# Altium integrated library 兰格封装.IntLib: 1176 symbols (part 2 of 6)
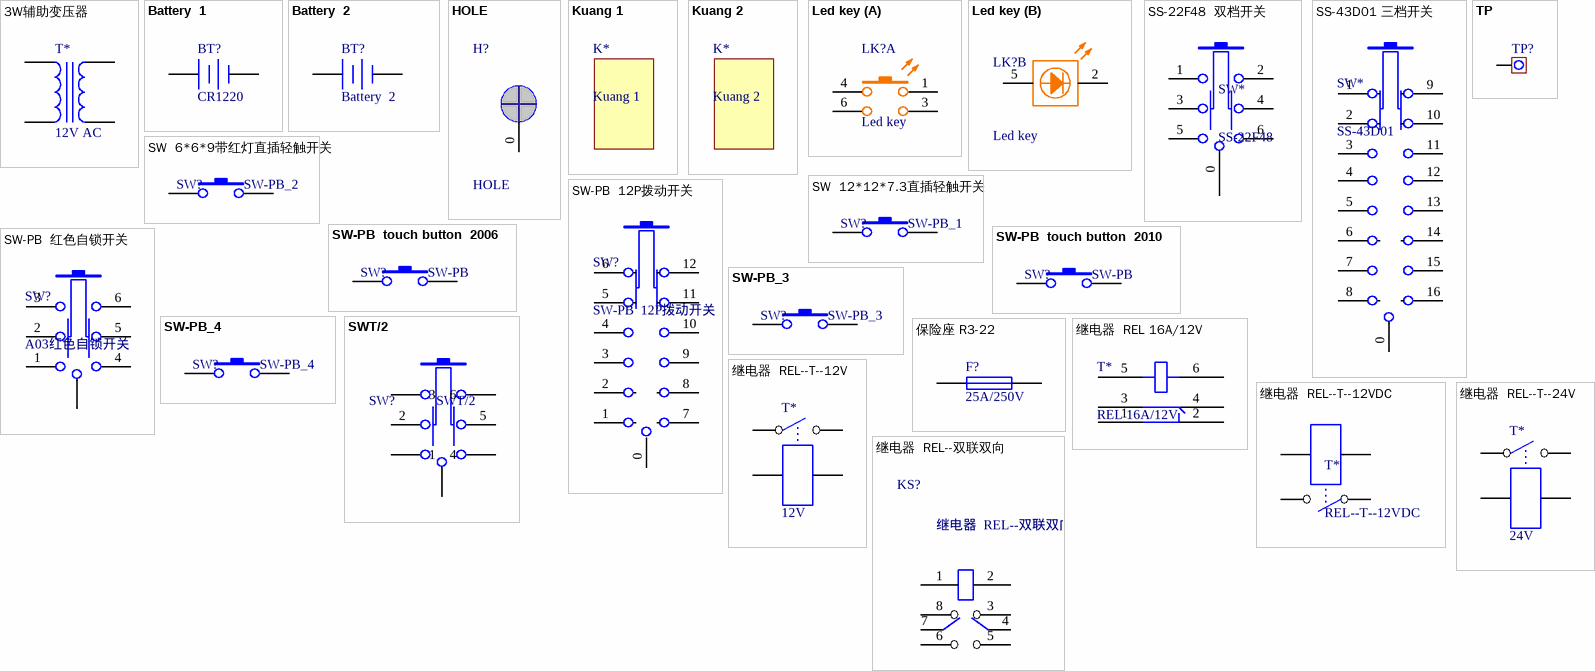
[diagram p49: symbols 3W辅助变压器 to 继电器  REL--双联双向]

## 保险座 R3-22
designator F?, comment 25A/250V
R3-22保险座; 物料代码: 3.02.08.01.0027; 助记码: R3-22BXZ; 单位: ֻ; 仓库名称: 五金仓; 加工方式: 插件; 物料名称: R3-22保险座; 规格型号: *; 备注: *
footprint 保险丝1
footprint 5X20保险座
pins: 1, 2

## 继电器  REL 16A/12V
designator T*, comment REL 16A/12V
HF115F-I/012-1HS3A继电器; 单位: ֻ; 备注: K-2000用; 物料代码: 3.01.11.0008; 助记码: HF115F-I/012-1HS3JDQ; 仓库名称: 元件仓; 加工方式: 插件; 规格型号: 16A/12V; 物料名称: HF115F-I/012-1HS3A继电器
footprint REL 16A/12V (继电器 16A/12V)
pins: 1, 2, 3, 4, 5, 6

## 继电器  REL--T--12V
designator T*, comment 12V
HF115F-I/012-1HS3A继电器; 物料代码: 3.01.11.0008; 助记码: HF115F-I/012-1HS3JDQ; 规格型号: 16A/12V; 单位: 个; 仓库名称: 元件仓; 加工方式: 插件; 物料名称: HF115F-I/012-1HS3A继电器
footprint REL T (T型继电器)
pins: 1, 2, 3, 4

## 继电器  REL--T--12VDC
designator T*, comment REL--T--12VDC
YX209E-S-112DM继电器; 单位: ֻ; 规格型号: 12VDC; 物料代码: 3.01.11.0011; 助记码: YX209E-S-112DMJDQ; 仓库名称: 元件仓; 加工方式: 插件; 物料名称: YX209E-S-112DM继电器
footprint REL T (T型继电器)
pins: 1, 2, 3, 4

## 继电器  REL--T--24V
designator T*, comment 24V
HF2150-1A-24DE继电器; 物料代码: 3.01.11.0006; 助记码: HF2150-1A-24DEJDQ; 单位: 个; 仓库名称: 元件仓; 加工方式: 插件; 物料名称: HF2150-1A-24DE继电器; 规格型号: *
footprint REL T (T型继电器)
pins: 1, 2, 3, 4

## 继电器  REL--双联双向
designator KS?
HK19F-12V-SHG继电器; 物料代码: 3.01.11.0010; 规格型号: 8脚12V 长20*宽10MM; 助记码: HK19F-12V-SHGJDQ; 仓库名称: 五金仓; 单位: 个; 加工方式: 插件; 物料名称: HK19F-12V-SHG继电器; 备注: *
footprint REL双联双向 (双联双向继电器)
pins: 1, 2, 3, 4, 5, 6, 7, 8


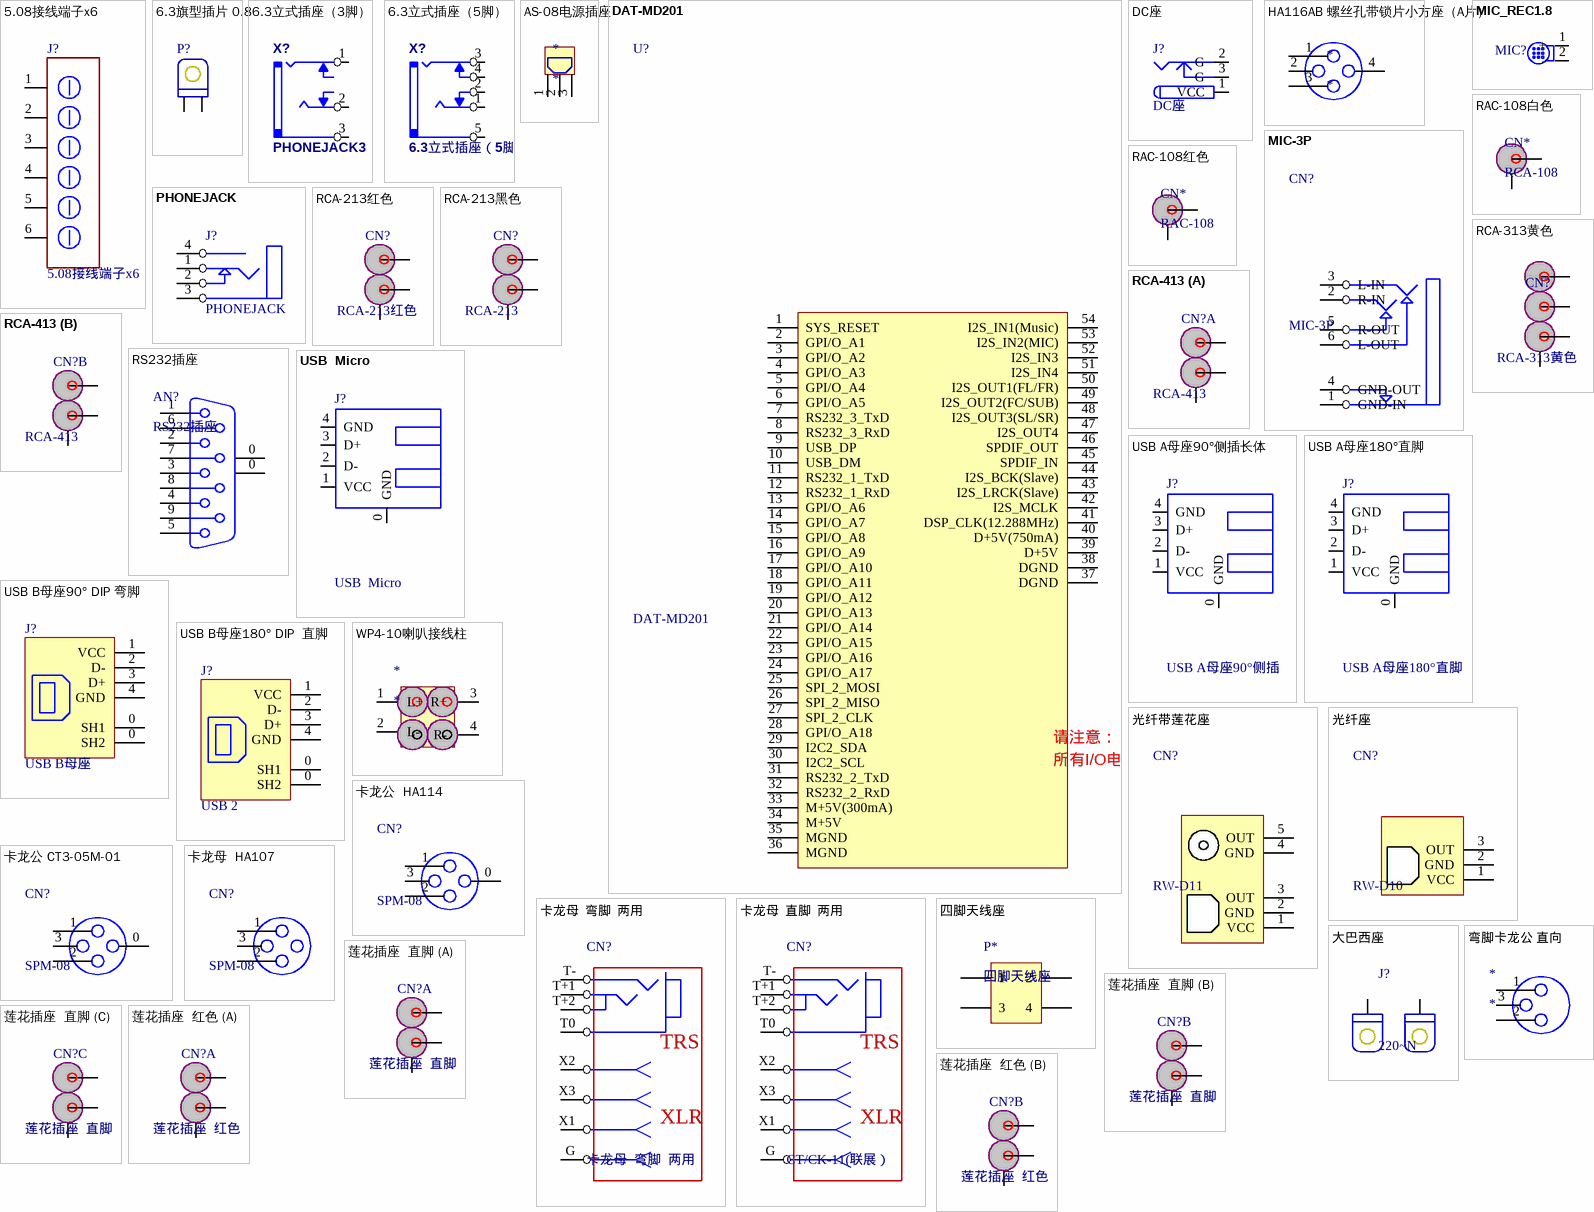
[diagram p11: symbols 5.08接线端子x6 to 莲花插座  红色]

## 5.08接线端子x6
designator J?
EX-2EDGK-5.08-6P插拔式接线端子; 物料代码: 3.02.08.05.0006; 仓库名称: 五金仓; 助记码: EX-2EDGK-5.08-6PCBSJ; 规格型号: 环铜/绿色/公母座; 单位: 套; 加工方式: 插件; 备注: T-1500用; 物料名称: EX-2EDGK-5.08-6P插拔式接线端子
footprint 5.08接线端子x6 (5.08接线端子6P   绿色)
pins: 1, 2, 3, 4, 5, 6

## 6.3旗型插片 0.8
designator P?
6.3旗型插片 0.8; 物料代码: 3.04.12.0003; 助记码: 6.3QXCP 0.8; 单位: PCS; 仓库名称: 五金仓; 物料名称: 6.3旗型插片 0.8
footprint 6.3旗型插片 0.8
pins: 1, 2

## 6.3立式插座（3脚）
designator X?, comment PHONEJACK3
6.3立式插座（3脚）单声道; 物料代码: 3.02.08.01.0011; 单位: 个; 仓库名称: 五金仓; 加工方式: 插件; 物料名称: 6.3立式插座（3脚）单声道
footprint 6.3立式座 (6.35 立式插座（3脚）  单声道)
pins: 1, 2, 3 G

## 6.3立式插座（5脚）
designator X?
6.3立式插座（5脚）立体声; 物料代码: 3.02.08.01.0012; 仓库名称: 五金仓; 单位: 个; 加工方式: 插件; 物料名称: 6.3立式插座（5脚）立体声; 助记码: *; 规格型号: *; 备注: *
footprint 6.3立式插座5脚 (6.3立式插座（5脚）立体声)
pins: 1 1a, 2 2b, 3 3c, 4 4d, 5 5e

## AS-08电源插座
designator *
单位: 个; 物料名称: AS-08电源插座; 仓库名称: 五金仓; 物料代码: 3.02.08.01.0060; 助记码: AS-08DYCZ; 规格型号: *; 备注: *; 加工方式: *
footprint AS-08电源插座
pins: 1, 2, 3

## DAT-MD201
designator U?
DAT-MD201模板; 单位: ֻ; 物料代码: *; 物料名称: *; 助记码: *; 规格型号: *; 仓库名称: *; 备注: *; 加工方式: *
pins: 1 SYS_RESET, 2 GPI/O_A1, 3 GPI/O_A2, 4 GPI/O_A3, 5 GPI/O_A4, 6 GPI/O_A5, 7 RS232_3_TxD, 8 RS232_3_RxD, 9 USB_DP, 10 USB_DM, 11 RS232_1_TxD, 12 RS232_1_RxD, 13 GPI/O_A6, 14 GPI/O_A7, 15 GPI/O_A8, 16 GPI/O_A9, 17 GPI/O_A10, 18 GPI/O_A11, 19 GPI/O_A12, 20 GPI/O_A13, 21 GPI/O_A14, 22 GPI/O_A15, 23 GPI/O_A16, 24 GPI/O_A17, 25 SPI_2_MOSI, 26 SPI_2_MISO, 27 SPI_2_CLK, 28 GPI/O_A18, 29 I2C2_SDA, 30 I2C2_SCL, 31 RS232_2_TxD, 32 RS232_2_RxD, 33 M+5V(300mA), 34 M+5V, 35 MGND, 36 MGND, 37 DGND, 38 DGND, 39 D+5V, 40 D+5V(750mA), 41 DSP_CLK(12.288MHz), 42 I2S_MCLK, 43 I2S_LRCK(Slave), 44 I2S_BCK(Slave), 45 SPDIF_IN, 46 SPDIF_OUT, 47 I2S_OUT4, 48 I2S_OUT3(SL/SR), 49 I2S_OUT2(FC/SUB), 50 I2S_OUT1(FL/FR), 51 I2S_IN4, 52 I2S_IN3, 53 I2S_IN2(MIC), 54 I2S_IN1(Music)
text: 请注意：; 所有I/O电平为3.3V

## DC座
designator J?
DC005环保电源插座; 物料代码: 3.02.08.01.0047; 助记码: DC005HBDYCZ; 规格型号: 2.1MM; 仓库名称: 五金仓; 单位: 个; 加工方式: 插件; 物料名称: DC005环保电源插座
footprint DC 座 (DC005环保电源插座    2.1MM)
pins: 1 VCC (power), 2 G (power), 3 G (power)

## HA116AB 螺丝孔带锁片小方座（A片）
designator *
HA116AB  螺丝孔带锁片小方座（A片）; 仓库名称: 五金仓; 助记码: HA116AB  LSKDSPXFZ（AP）; 单位: 个; 物料代号: 3.02.08.01.0013; 规格型号: *; 物料名称: HA116AB  螺丝孔带锁片小方座（A片）; 加工方式: *; 备注: *
footprint HA116AB  螺丝孔带锁片小方座（A片）
pins: 1 1+, 2 1-, 3 2+, 4 2-

## MIC-3P
designator CN?
6.35插座 六脚; 物料代码: 3.02.08.01.0034; 单位: 个; 助记码: 6.35CZ LJ; 规格型号: CK-6.35-636; 仓库名称: 五金仓; 加工方式: 插件; 物料名称: 6.35插座 六脚
footprint SJ-6307A(正威)
pins: 1 GND-IN, 2 R-IN, 3 L-IN, 4 GND-OUT, 5 R-OUT, 6 L-OUT

## MIC_REC1.8
designator MIC?  (value not drawn)
扬声器接口; 加工方式: 插件; 物料代码: *; 物料名称: *; 助记码: *; 规格型号: *; 单位: *; 仓库名称: *
footprint XH2A(2.54mm) (MIC)
pins: 1 +, 2 -

## PHONEJACK
designator J?
加工方式: 贴片; 单位: 个; 物料名称: *; 助记码: *; 规格型号: *
footprint PHONEJACK 3.5
pins: 1 L, 2 R, 3 GND, 4 MIC

## RAC-108白色
designator CN*, comment RCA-108
RCA-108莲花插座 白色; 仓库名称: 五金仓; 加工方式: 插件; 单位: 个; 物料代码: 3.02.08.01.0007; 物料名称: RCA-108莲花插座 白色; 规格型号: *; 助记码: *
footprint RCA-108白色 (RCA-108莲花插座  白色)
pins: 1 GND, 2

## RAC-108红色
designator CN*, comment RAC-108
RCA-108莲花插座 红色; 加工方式: 插件; 物料代码: 3.02.08.01.0008; 仓库名称: 五金仓; 单位: 个; 物料名称: RCA-108莲花插座 红色; 助记码: *; 规格型号: *
footprint RCA-108红色 (RCA-108莲花插座  红色)
pins: 1 GND, 2

## RCA-213红色
designator CN?
RCA-213莲花插座 红色; 物料代码: 3.02.08.01.0037; 单位: 个; 仓库名称: 五金仓; 加工方式: 插件; 物料名称: RCA-213莲花插座 红色; 规格型号: *
footprint RCA-213 (RCA-213莲花插座  红色)
pins: 1 GND, 2 L, 3 R

## RCA-213黑色
designator CN?, comment RCA-213
RCA-213莲花插座 黑色; 物料代码: 3.02.08.01.0003; 单位: 个; 仓库名称: 五金仓; 加工方式: 插件; 物料名称: RCA-213莲花插座 黑色; 规格型号: *
footprint RAC-213黑色 (RAC-213莲花插座黑色2)
pins: 1 GND, 2 L, 3 R

## RCA-313黄色
designator CN?
RCA-313莲花插座 黄色; 物料代码: 3.02.08.01.0038; 助记码: RCA-313LHCZ HS; 单位: 个; 仓库名称: 五金仓; 加工方式: 插件; 物料名称: RCA-313莲花插座 黄色; 规格型号: *
footprint RCA-313 (RCA-313莲花插座  黄色)
pins: 1 GND, 2 L, 3 R, 4 V

## RCA-413
designator CN?
RCA-413莲花插座 红色; 物料代码: 3.02.08.01.0006; 单位: 个; 仓库名称: 五金仓; 加工方式: 插件; 物料名称: RCA-413莲花插座 红色; 规格型号: *
footprint RCA-413 (RCA-413莲花插座  红色)
part A pins: 2 L, 3 R, 4 GND
part B pins: 1 GND, 5 L, 6 R

## RS232插座
designator AN?
仓库名称: 五金仓; 规格型号: DB-09F-01母座; 单位: 个; 物料代码: 3.02.08.01.0036; 加工方式: 插件; 助记码: RS232CZ; 物料名称: RS232插座
footprint RS232插座 (RS232插座  DB-09F-01母座)
pins: 0 MH2, 0 MH1, 1, 2, 3, 4, 5, 6, 7, 8, 9

## USB  Micro
designator J?
仓库名称: 五金仓; 单位: 个; 加工方式: 插件; 物料名称: USB  Micro; 备注: *
footprint USB  Micro
pins: 0 GND, 1 VCC, 2 D-, 3 D+, 4 GND

## USB A母座90°侧插长体
designator J?, comment USB A母座90°侧插
USB A母座90°侧插长体; 物料代码: 3.02.08.08.0006; 助记码: USB AMZ90°CCCT; 规格型号: LZ-UAF-24; 仓库名称: 五金仓; 单位: 个; 加工方式: 插件; 物料名称: USB A母座90°侧插长体; 备注: *
footprint USB 母座A 90°侧插长体 (USB A母座90°侧插长体      LZ-UAF-24)
pins: 0 GND, 1 VCC, 2 D-, 3 D+, 4 GND

## USB A母座180°直脚
designator J?
USB A母座180°直接15.0弯脚; 物料代码: 3.02.08.08.0003; 助记码: USB AMZ180°ZJ15.0WJ; 规格型号: LZ-UAF-21; 仓库名称: 五金仓; 单位: 个; 加工方式: 插件; 物料名称: USB A母座180°直接15.0弯脚; 备注: *
footprint USB 母座 A (USB  A母座180°C直接15.0弯脚    LZ-UAF-21)
pins: 0 GND, 1 VCC, 2 D-, 3 D+, 4 GND

## USB B母座90° DIP 弯脚
designator J?, comment USB B母座
USB B母座90° DIP 弯脚; 物料代码: 3.02.08.08.0004; 助记码: USB BMZ90° DIP WJ; 仓库名称: 五金仓; 规格型号: LZ-UBF-01; 单位: 个; 加工方式: 插件; 物料名称: USB B母座90° DIP 弯脚; 备注: *
footprint USB  B母座  弯脚 (USB B母座90° DIP 弯脚)
pins: 0 SH1, 0 SH2, 1 VCC, 2 D-, 3 D+, 4 GND

## USB B母座180° DIP  直脚
designator J?, comment USB 2
USB B母座180° DIP; 物料代码: 3.02.08.08.0001; 助记码: USB BMZ180° DIP; 仓库名称: 五金仓; 规格型号: LZ-UBF-02; 单位: 个; 加工方式: 插件; 物料名称: USB B母座180° DIP; 备注: *
footprint USB  B母座  直脚 (USB B母座180° DIP)
pins: 0 SH1, 0 SH2, 1 VCC, 2 D-, 3 D+, 4 GND

## WP4-10喇叭接线柱
designator *
WP4-10喇叭接线柱; 加工方式: 插件; 仓库名称: 五金仓; 助记码: WP4-10LBJXZ; 单位: 个; 物料代码: 3.02.08.05.0005; 物料名称: WP4-10喇叭接线柱; 规格型号: *
footprint WP4-10喇叭接线柱
pins: 1 L+, 2 L-, 3 R+, 4 R-

## 光纤带莲花座
designator CN?, comment RW-D11
光纤带莲花座 接收; 物料代码: 3.02.08.01.0035; 助记码: GXDLHZ JS; 仓库名称: 五金仓; 单位: 个; 加工方式: 插件; 物料名称: 光纤带莲花座 接收; 规格型号: *
footprint 光纤带莲花座 (光纤带莲花座  接收)
pins: 1 VCC (power), 2 GND (power), 3 OUT (power), 4 GND (power), 5 OUT (power)

## 光纤座
designator CN?, comment RW-D10
光纤座; 仓库名称: 五金仓; 单位: 个; 加工方式: 插件; 物料名称: 光纤座; 规格型号: *
footprint 光纤座 (光纤座  接收)
pins: 1 VCC (power), 2 GND (power), 3 OUT (power)

## 卡龙公  HA114
designator CN?, comment SPM-08
HA114卡龙公; 物料代码: 3.02.08.02.0001; 助记码: HA114KLG; 仓库名称: 五金仓; 单位: 个; 加工方式: 插件; 物料名称: HA114卡龙公; 规格型号: *
footprint 卡龙公   立式 (HA114卡龙公)
pins: 0 GND, 1 G, 2 +, 3 -

## 卡龙公 CT3-05M-01
designator CN?, comment SPM-08
CT3-05M-01卡龙公; 物料代码: 3.02.08.02.0004; 助记码: CT3-05M-01KLG; 仓库名称: 五金仓; 单位: 个; 加工方式: 插件; 物料名称: CT3-05M-01卡龙公; 规格型号: *
footprint 卡龙公 (CT3-05M-01卡龙公)
pins: 0 GND, 1 G, 2 +, 3 -

## 卡龙母  HA107
designator CN?, comment SPM-08
HA107卡龙母; 物料代码: 3.02.08.02.0002; 助记码: HA107KLM; 仓库名称: 五金仓; 单位: 个; 加工方式: 插件; 物料名称: HA107卡龙母; 规格型号: *
footprint 卡侬母 (HA107卡龙母)
pins: 1 G, 2 +, 3 -

## 卡龙母  弯脚  两用
designator CN?
CK/CT3-11W两用卡龙母弯脚; 单位: 个; 物料代码: 3.02.08.02.0006; 助记码: CK/CT3-11WLYKLMWJ; 仓库名称: 五金仓; 加工方式: 插件; 物料名称: CK/CT3-11W两用卡龙母弯脚; 规格型号: *
footprint 两用卡龙母  弯脚 (CK/CT3-11W两用卡龙母弯脚)
pins: G, T0, T+1, T+2, T-, X1, X2, X3
text: TRS; XLR

## 卡龙母  直脚  两用
designator CN?, comment CT/CK-11(联展）
CK/CT3-11两用卡龙母; 物料代码: 3.02.08.02.0005; 单位: 个; 助记码: CK/CT3-11LYKLM; 仓库名称: 五金仓; 加工方式: 插件; 物料名称: CK/CT3-11两用卡龙母; 规格型号: *
footprint 两用卡龙母 (CK/CT3-11两用卡龙母)
pins: G, T0, T+1, T+2, T-, X1, X2, X3
text: TRS; XLR

## 四脚天线座
designator P*
物料代码: 3.02.08.01.0049; 仓库名称: 五金仓; 助记码: SJTXZ; 单位: ֻ; 加工方式: 插件; 物料名称: 四脚天线座; 规格型号: *; 备注: *
footprint 四脚天线座
pins: 1, 2, 3, 4

## 大巴西座
designator J?, comment 220~N
大巴西座; 物料代码: 3.02.08.01.0043; 助记码: DBXZ; 仓库名称: 五金仓; 加工方式: 插件; 单位: 个; 物料名称: 大巴西座; 规格型号: *
footprint 大巴西座
pins: 1, 2

## 弯脚卡龙公 直向
designator *
弯脚卡龙公 直向; 仓库名称: 五金仓; 单位: 个; 物料代码: 3.02.08.02.0003; 规格型号: *; 物料名称: 弯脚卡龙公 直向; 加工方式: *; 助记码: *; 备注: *
footprint 弯脚卡龙公 直向
pins: 1 G, 2 +, 3 -

## 莲花插座  直脚
designator CN?
AV6-10直脚莲花插座 白色; 物料代码: 3.02.08.01.0044; 助记码: AV6-10ZJLHCZ BS; 单位: 个; 仓库名称: 五金仓; 加工方式: 插件; 物料名称: AV6-10直脚莲花插座 白色
footprint AV6-10 (AV6-10直脚莲花插座  白色)
part A pins: 1 GND, 2 L, 3 R
part B pins: 4 GND, 5 L, 6 R
part C pins: 7 GND, 8 L, 9 R

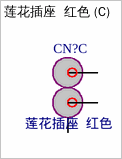
[diagram p12: symbol 莲花插座  红色]

## 莲花插座  红色
designator CN?
RCA-613莲花插座 红色; 物料代码: 3.02.08.01.0033; 助记码: RCA-613LHCZ HS; 单位: 个; 仓库名称: 五金仓; 加工方式: 插件; 物料名称: RCA-613莲花插座 红色; 规格型号: *
footprint RCA-613 (RCA-613莲花插座  红色)
part A pins: 2 L, 3 R, 4 GND
part B pins: 1 GND, 5 L, 6 R
part C pins: 7 GND, 8 L, 9 R


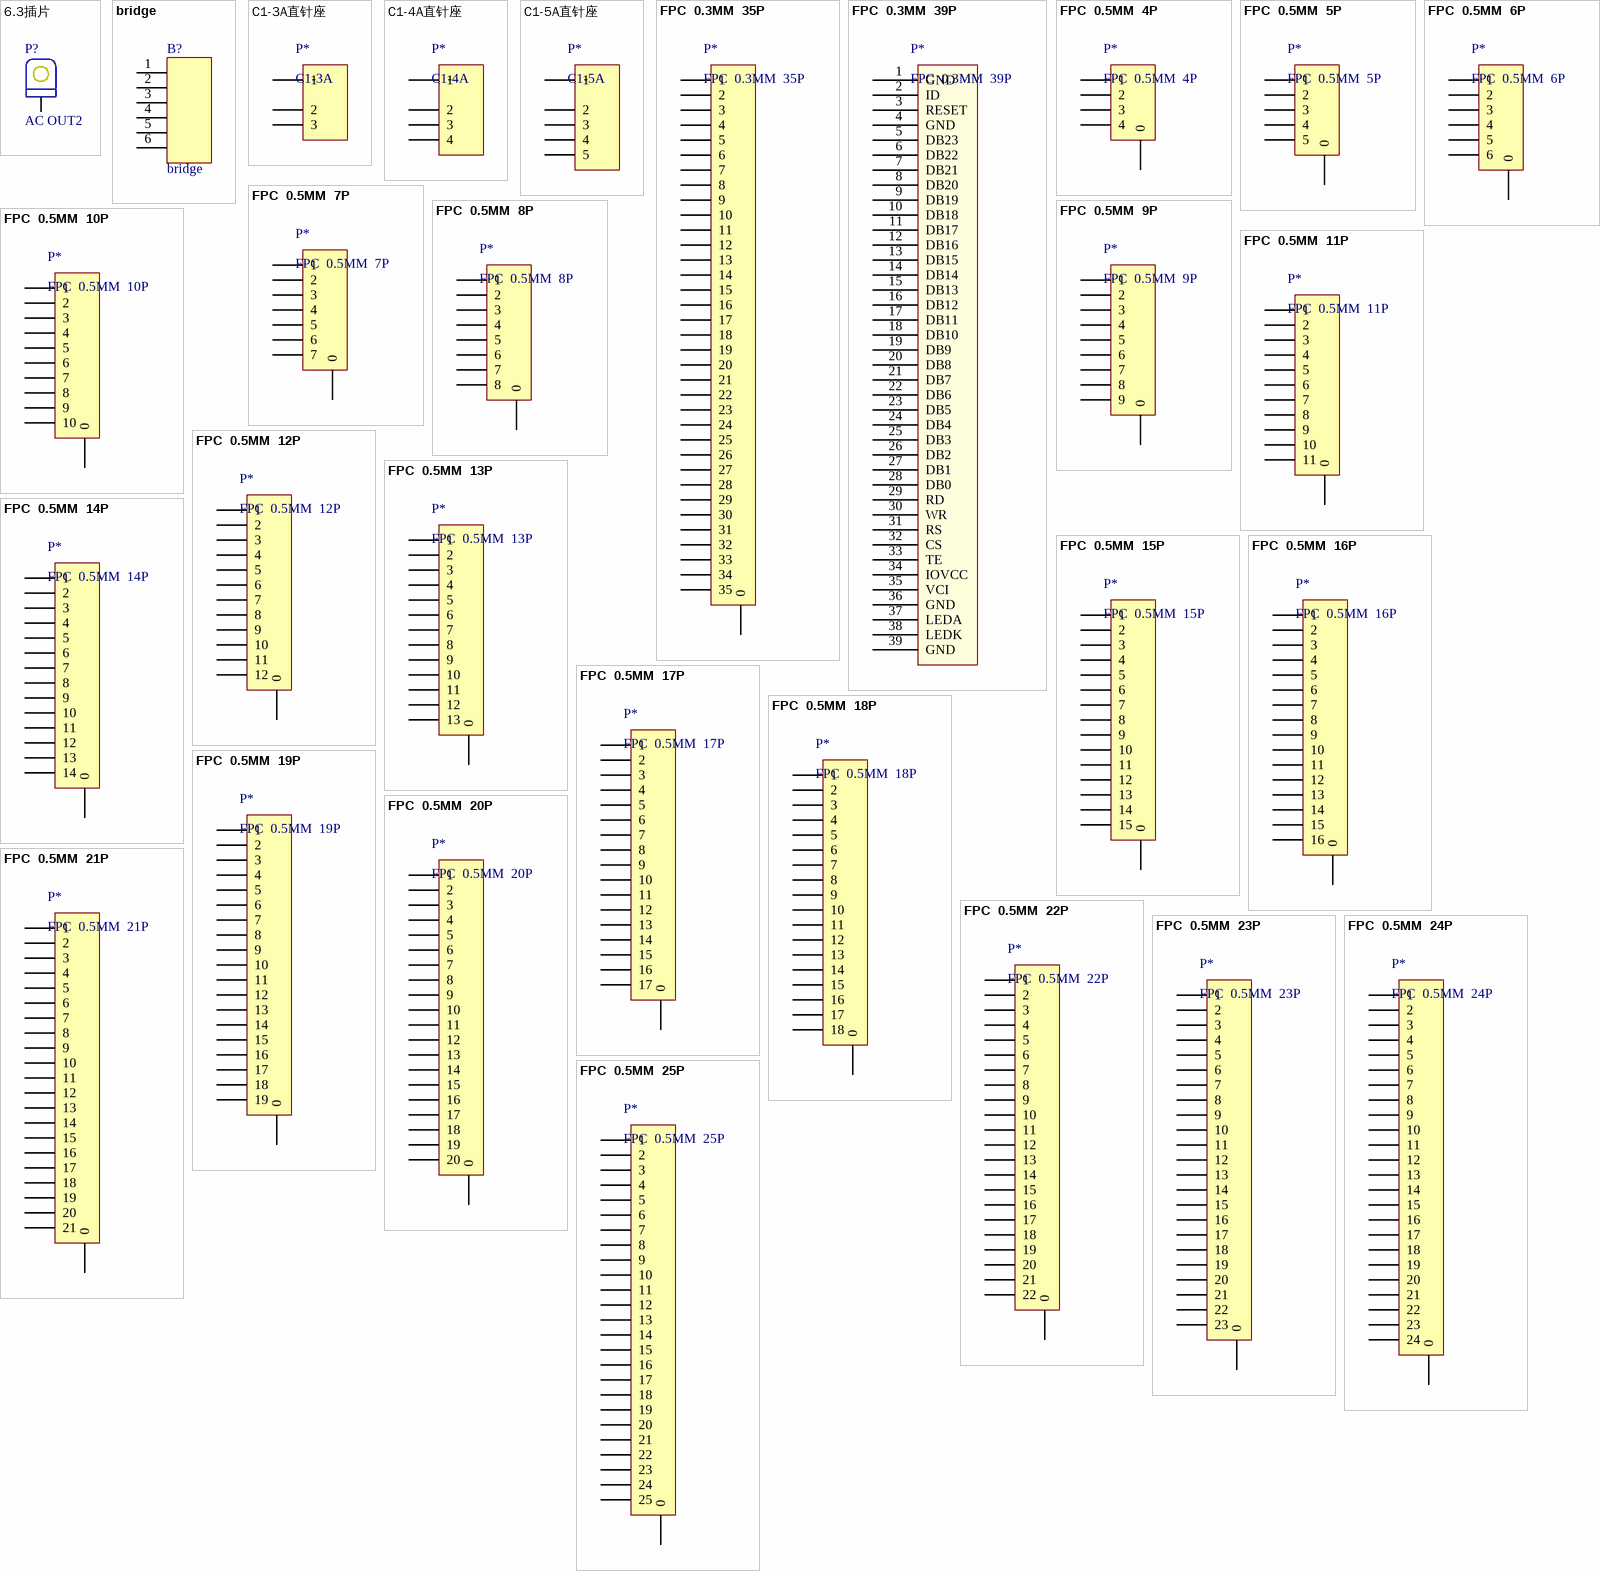
[diagram p13: symbols 6.3插片 to FPC  0.5MM  25P]

## 6.3插片
designator P?, comment AC OUT2
6.3旗型插片 0.8; 物料代码: 3.04.12.0003; 助记码: 6.3QXCP 0.8; 单位: 个; 仓库名称: 五金仓; 加工方式: 插件; 物料名称: 6.3旗型插片 0.8; 规格型号: *
footprint 6.3插片
pins: 1

## bridge
designator B?
仓库名称: 五金仓; 单位: ֻ; 加工方式: 插件; 物料名称: *; 物料代码: *; 助记码: *; 规格型号: *; 备注: *
footprint bridge (手机唛支架)
pins: 1, 2, 3, 4, 5, 6

## C1-3A直针座
designator P*, comment C1-3A
C1-3A直针座; 物料代码: 3.02.08.01.0015; 仓库名称: 五金仓; 助记码: C1-3AZZZ; 单位: 个; 加工方式: 插件; 规格型号: *; 物料名称: C1-3A直针座; 备注: *
footprint C1-3A   8MM (CA-3A直插座)
pins: 1, 2, 3

## C1-4A直针座
designator P*, comment C1-4A
C1-4A直针座; 物料代码: 3.02.08.01.0016; 仓库名称: 五金仓; 助记码: C1-4AZZZ; 单位: 个; 加工方式: 插件; 规格型号: *; 物料名称: C1-4A直针座; 备注: *
footprint C1-4A   8MM (CA-4A直插座)
pins: 1, 2, 3, 4

## C1-5A直针座
designator P*, comment C1-5A
C1-5A直针座; 物料代码: 3.02.08.01.0041; 仓库名称: 五金仓; 助记码: C1-5AZZZ; 单位: 个; 加工方式: 插件; 规格型号: *; 物料名称: C1-5A直针座; 备注: *
footprint C1-5A   8MM (CA-5A直插座)
pins: 1, 2, 3, 4, 5

## FPC  0.3MM  35P
designator P*
0.3MM间距35P翻盖式FPC连接器; 规格型号: 0.3K-DX-35PWB 1.0H 镀金/白色; 物料代码: 3.02.08.07.0013; 仓库名称: 五金仓; 助记码: 0.3MMJJ35PFGSFPCLJQ; 单位: ֻ; 加工方式: 贴片; 物料名称: 0.3MM间距35P翻盖式FPC连接器; 备注: *
footprint FPC  0.3  35P
pins: 0, 1, 2, 3, 4, 5, 6, 7, 8, 9, 10, 11, 12, 13, 14, 15, 16, 17, 18, 19, 20, 21, 22, 23, 24, 25, 26, 27, 28, 29, 30, 31, 32, 33, 34, 35

## FPC  0.3MM  39P
designator P*
0.3MM间距39P翻盖下接镀金贴片FPC连接器; 仓库名称: 五金仓; 规格型号: H1.0卷装; 单位: ֻ; 物料代码: 3.02.08.07.0016; 助记码: 0.3MMJJ39PFGXJDJTPFP; 加工方式: 贴片; 物料名称: 0.3MM间距39P翻盖下接镀金贴片FPC连接器; 备注: *
footprint FPC  0.3  39P (2006用)
pins: 1 GND, 2 ID, 3 RESET, 4 GND, 5 DB23, 6 DB22, 7 DB21, 8 DB20, 9 DB19, 10 DB18, 11 DB17, 12 DB16, 13 DB15, 14 DB14, 15 DB13, 16 DB12, 17 DB11, 18 DB10, 19 DB9, 20 DB8, 21 DB7, 22 DB6, 23 DB5, 24 DB4, 25 DB3, 26 DB2, 27 DB1, 28 DB0, 29 RD, 30 WR, 31 RS, 32 CS, 33 TE, 34 IOVCC, 35 VCI, 36 GND, 37 LEDA, 38 LEDK, 39 GND

## FPC  0.5MM  4P
designator P*
FPC0.5 2H-S-W-4P; 仓库名称: 五金仓; 加工方式: 贴片; 物料代码: *; 物料名称: *; 备注: *; 规格型号: *; 单位: *; 助记码: *
footprint FPC  0.5   04P (长：6.2mm，宽：5.2mm，高：2mm)
pins: 0, 1, 2, 3, 4

## FPC  0.5MM  5P
designator P*
FPC0.5 2H-S-W-5P; 仓库名称: 五金仓; 加工方式: 贴片; 规格型号: *; 物料名称: *; 物料代码: *; 助记码: *; 单位: *; 备注: *
footprint FPC0.5 2H-S-W-5P (长：6.7mm，宽：5.2mm，高：2mm)
pins: 0, 1, 2, 3, 4, 5

## FPC  0.5MM  6P
designator P*
FPC0.5 2H-S-W-6P; 仓库名称: 五金仓; 加工方式: 贴片; 规格型号: *; 物料名称: *; 单位: *; 物料代码: *; 助记码: *; 备注: *
footprint FPC0.5 2H-S-W-6P (长：7.2mm，宽：5.2mm，高：2mm)
pins: 0, 1, 2, 3, 4, 5, 6

## FPC  0.5MM  7P
designator P*
FPC0.5 2H-S-W-7P; 仓库名称: 五金仓; 加工方式: 贴片; 规格型号: *; 物料名称: *; 物料代码: *; 助记码: *; 单位: *; 备注: *
footprint FPC0.5 2H-S-W-7P (长：7.7mm，宽：5.2mm，高：2mm)
pins: 0, 1, 2, 3, 4, 5, 6, 7

## FPC  0.5MM  8P
designator P*
FPC0.5 2H-S-W-8P; 仓库名称: 五金仓; 加工方式: 贴片; 物料名称: *; 物料代码: *; 规格型号: *; 单位: *; 助记码: *; 备注: *
footprint FPC0.5 2H-S-W-8P (长：8.2mm，宽：5.2mm，高：2mm)
pins: 0, 1, 2, 3, 4, 5, 6, 7, 8

## FPC  0.5MM  9P
designator P*
FPC0.5 2H-S-W-9P; 仓库名称: 五金仓; 加工方式: 贴片; 规格型号: *; 助记码: *; 单位: *; 备注: *; 物料代码: *; 物料名称: *
footprint FPC0.5 2H-S-W-9P (长：8.7mm，宽：5.2mm，高：2mm)
pins: 0, 1, 2, 3, 4, 5, 6, 7, 8, 9

## FPC  0.5MM  10P
designator P*
FPC0.5 2H-S-W-10P; 仓库名称: 五金仓; 加工方式: 贴片; 助记码: *; 单位: *; 物料名称: *; 备注: *; 规格型号: *
footprint FPC  0.5  10P
pins: 0, 1, 2, 3, 4, 5, 6, 7, 8, 9, 10

## FPC  0.5MM  11P
designator P*
FPC0.5 2H-S-W-11P; 仓库名称: 五金仓; 加工方式: 贴片; 物料名称: *; 规格型号: *; 单位: *; 备注: *; 助记码: *; 物料代码: *
footprint FPC  0.5  11P
pins: 0, 1, 2, 3, 4, 5, 6, 7, 8, 9, 10, 11

## FPC  0.5MM  12P
designator P*
FPC0.5 2H-S-W-12P; 仓库名称: 五金仓; 加工方式: 贴片; 物料名称: *; 物料代码: *; 规格型号: *; 助记码: *; 单位: *; 备注: *
footprint FPC  0.5  12P
pins: 0, 1, 2, 3, 4, 5, 6, 7, 8, 9, 10, 11, 12

## FPC  0.5MM  13P
designator P*
FPC0.5 2H-S-W-13P; 仓库名称: 五金仓; 加工方式: 贴片; 规格型号: *; 助记码: *; 单位: *; 备注: *; 物料代码: *; 物料名称: *
footprint FPC  0.5  13P
pins: 0, 1, 2, 3, 4, 5, 6, 7, 8, 9, 10, 11, 12, 13

## FPC  0.5MM  14P
designator P*
FPC0.5 2H-S-W-14P; 仓库名称: 五金仓; 加工方式: 贴片; 物料名称: *; 规格型号: *; 助记码: *; 单位: *; 备注: *; 物料代码: *
footprint FPC  0.5  14P
pins: 0, 1, 2, 3, 4, 5, 6, 7, 8, 9, 10, 11, 12, 13, 14

## FPC  0.5MM  15P
designator P*
FPC0.5 2H-S-W-15P; 仓库名称: 五金仓; 加工方式: 贴片; 规格型号: *; 物料代码: *; 物料名称: *; 助记码: *; 备注: *; 单位: *
footprint FPC  0.5  15P
pins: 0, 1, 2, 3, 4, 5, 6, 7, 8, 9, 10, 11, 12, 13, 14, 15

## FPC  0.5MM  16P
designator P*
FPC0.5 2H-S-W-16P; 仓库名称: 五金仓; 加工方式: 贴片; 规格型号: *; 物料代码: *; 物料名称: *; 备注: *; 单位: *; 助记码: *
footprint FPC  0.5  16P
pins: 0, 1, 2, 3, 4, 5, 6, 7, 8, 9, 10, 11, 12, 13, 14, 15, 16

## FPC  0.5MM  17P
designator P*
FPC0.5 2H-S-W-17P; 仓库名称: 五金仓; 加工方式: 贴片; 规格型号: *; 助记码: *; 单位: *; 物料代码: *; 物料名称: *; 备注: *
footprint FPC  0.5  17P
pins: 0, 1, 2, 3, 4, 5, 6, 7, 8, 9, 10, 11, 12, 13, 14, 15, 16, 17

## FPC  0.5MM  18P
designator P*
FPC0.5 2H-S-W-18P; 仓库名称: 五金仓; 加工方式: 贴片; 备注: *; 物料代码: *; 物料名称: *; 规格型号: *; 助记码: *; 单位: *
footprint FPC  0.5  18P
pins: 0, 1, 2, 3, 4, 5, 6, 7, 8, 9, 10, 11, 12, 13, 14, 15, 16, 17, 18

## FPC  0.5MM  19P
designator P*
FPC0.5 2H-S-W-19P; 仓库名称: 五金仓; 加工方式: 贴片; 规格型号: *; 物料名称: *; 助记码: *; 单位: *; 备注: *; 物料代码: *
footprint FPC  0.5  19P
pins: 0, 1, 2, 3, 4, 5, 6, 7, 8, 9, 10, 11, 12, 13, 14, 15, 16, 17, 18, 19

## FPC  0.5MM  20P
designator P*
FPC0.5 2H-S-W-20P; 仓库名称: 五金仓; 加工方式: 贴片; 助记码: *; 单位: *; 备注: *; 物料代码: *; 物料名称: *; 规格型号: *
footprint FPC  0.5  20P
pins: 0, 1, 2, 3, 4, 5, 6, 7, 8, 9, 10, 11, 12, 13, 14, 15, 16, 17, 18, 19, 20

## FPC  0.5MM  21P
designator P*
FPC0.5 2H-S-W-21P; 仓库名称: 五金仓; 加工方式: 贴片; 物料名称: *; 规格型号: *; 助记码: *; 单位: *; 备注: *; 物料代码: *
footprint FPC  0.5  21P
pins: 0, 1, 2, 3, 4, 5, 6, 7, 8, 9, 10, 11, 12, 13, 14, 15, 16, 17, 18, 19, 20, 21

## FPC  0.5MM  22P
designator P*
FPC0.5 2H-S-W-22P; 仓库名称: 五金仓; 加工方式: 贴片; 规格型号: *; 助记码: *; 备注: *; 物料代码: *; 单位: *; 物料名称: *
footprint FPC  0.5  22P
pins: 0, 1, 2, 3, 4, 5, 6, 7, 8, 9, 10, 11, 12, 13, 14, 15, 16, 17, 18, 19, 20, 21, 22

## FPC  0.5MM  23P
designator P*
FPC0.5 2H-S-W-23P; 仓库名称: 五金仓; 加工方式: 贴片; 规格型号: *; 物料名称: *; 物料代码: *; 单位: *; 备注: *; 助记码: *
footprint FPC  0.5  23P
pins: 0, 1, 2, 3, 4, 5, 6, 7, 8, 9, 10, 11, 12, 13, 14, 15, 16, 17, 18, 19, 20, 21, 22, 23

## FPC  0.5MM  24P
designator P*
FPC0.5 2H-S-W-24P; 仓库名称: 五金仓; 加工方式: 贴片; 单位: *; 助记码: *; 备注: *; 物料代码: *; 物料名称: *; 规格型号: *
footprint FPC  0.5  24P
pins: 0, 1, 2, 3, 4, 5, 6, 7, 8, 9, 10, 11, 12, 13, 14, 15, 16, 17, 18, 19, 20, 21, 22, 23, 24

## FPC  0.5MM  25P
designator P*
FPC0.5 2H-S-W-25P; 仓库名称: 五金仓; 加工方式: 贴片; 助记码: *; 单位: *; 备注: *; 物料代码: *; 物料名称: *; 规格型号: *
footprint FPC  0.5  25P
pins: 0, 1, 2, 3, 4, 5, 6, 7, 8, 9, 10, 11, 12, 13, 14, 15, 16, 17, 18, 19, 20, 21, 22, 23, 24, 25

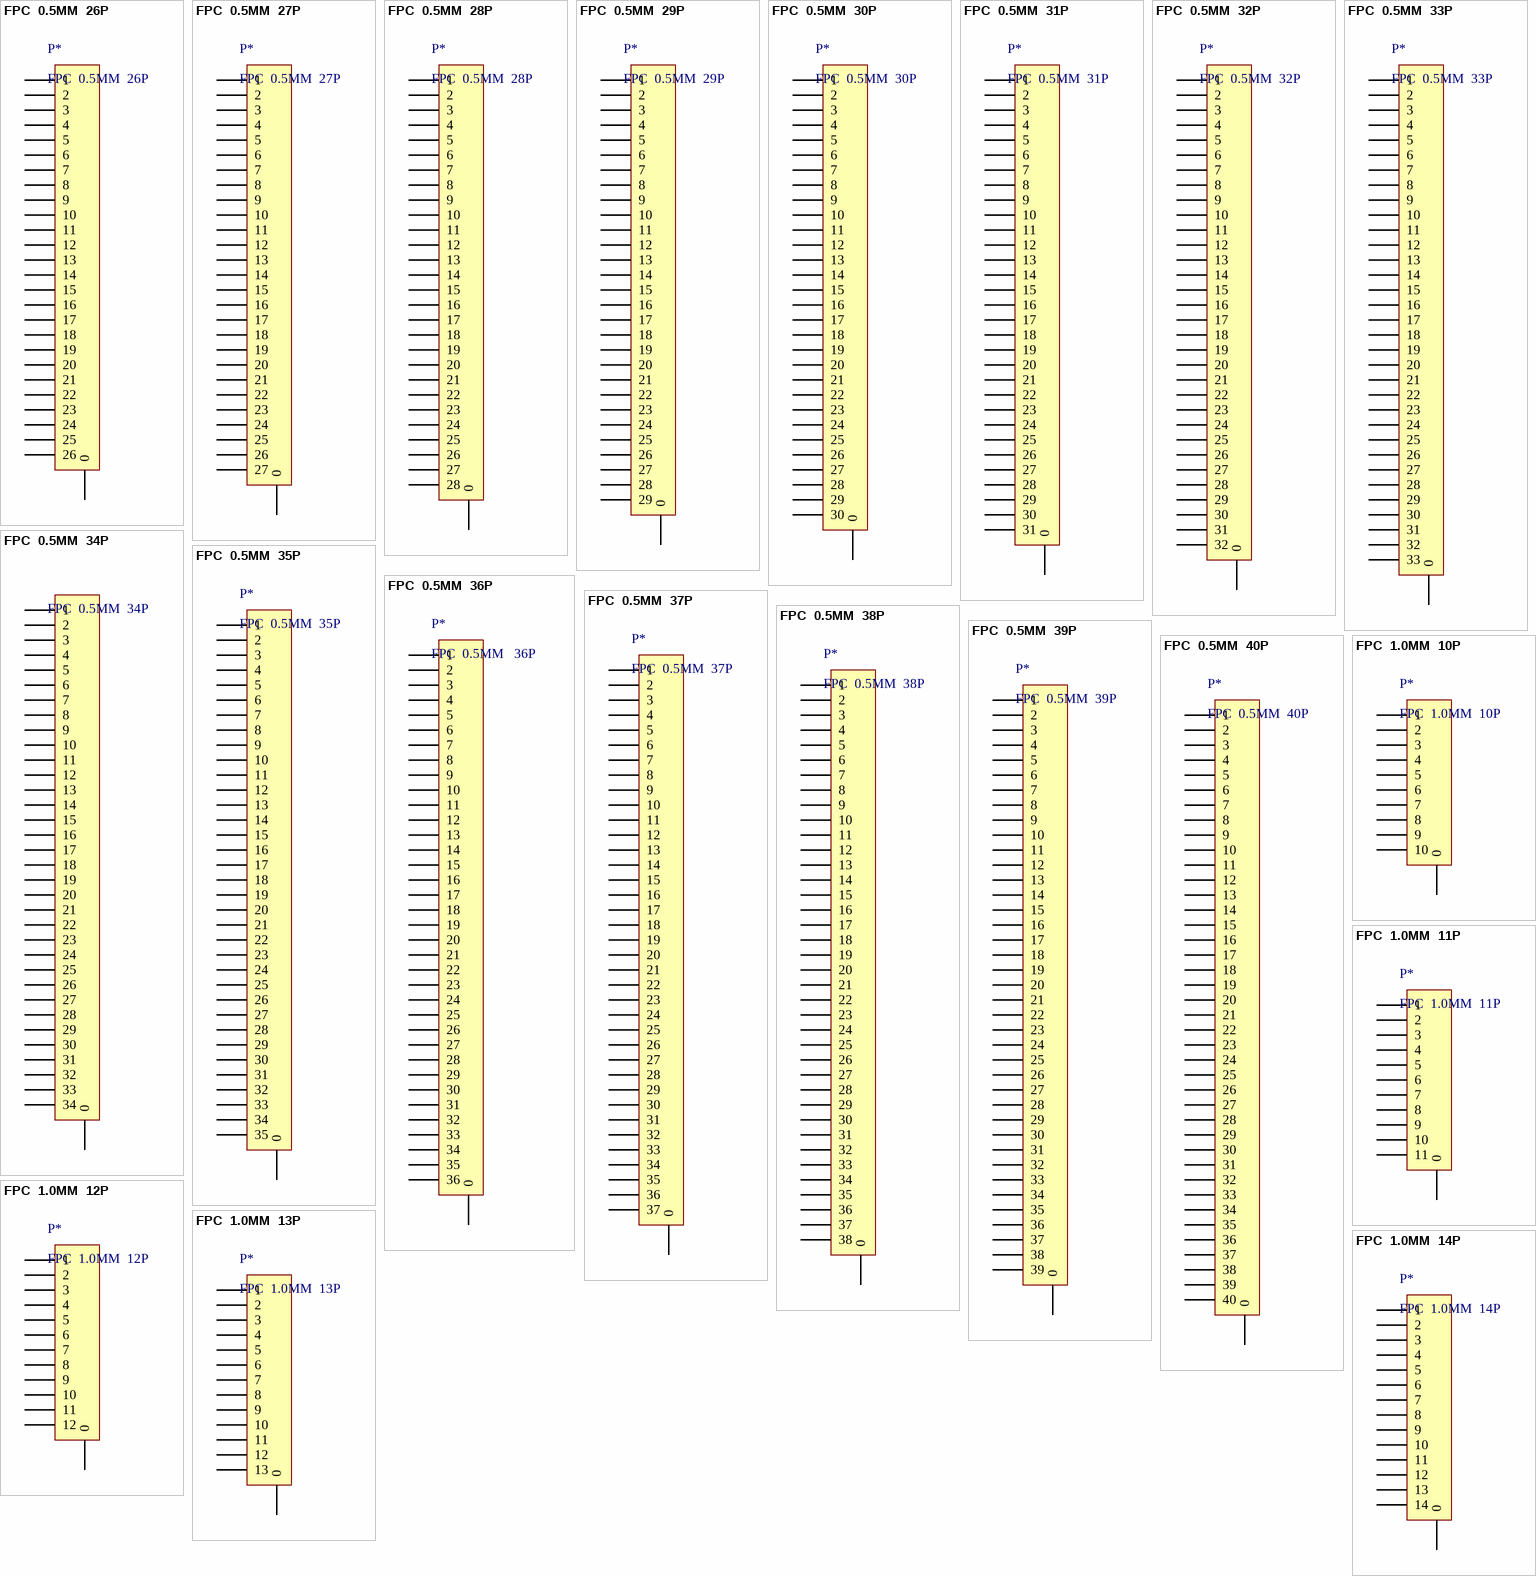
[diagram p14: symbols FPC  0.5MM  26P to FPC  1.0MM  14P]

## FPC  0.5MM  26P
designator P*
FPC0.5 2H-S-W-26P; 仓库名称: 五金仓; 加工方式: 贴片; 规格型号: *; 助记码: *; 单位: *; 备注: *; 物料代码: *; 物料名称: *
footprint FPC  0.5  26P
pins: 0, 1, 2, 3, 4, 5, 6, 7, 8, 9, 10, 11, 12, 13, 14, 15, 16, 17, 18, 19, 20, 21, 22, 23, 24, 25, 26

## FPC  0.5MM  27P
designator P*
FPC0.5 2H-S-W-27P; 仓库名称: 五金仓; 加工方式: 贴片; 单位: *; 规格型号: *; 助记码: *; 物料名称: *; 物料代码: *; 备注: *
footprint FPC  0.5  27P
pins: 0, 1, 2, 3, 4, 5, 6, 7, 8, 9, 10, 11, 12, 13, 14, 15, 16, 17, 18, 19, 20, 21, 22, 23, 24, 25, 26, 27

## FPC  0.5MM  28P
designator P*
FPC0.5 2H-S-W-28P; 仓库名称: 五金仓; 加工方式: 贴片; 物料名称: *; 规格型号: *; 物料代码: *; 助记码: *; 单位: *; 备注: *
footprint FPC  0.5  28P
pins: 0, 1, 2, 3, 4, 5, 6, 7, 8, 9, 10, 11, 12, 13, 14, 15, 16, 17, 18, 19, 20, 21, 22, 23, 24, 25, 26, 27, 28

## FPC  0.5MM  29P
designator P*
FPC0.5 2H-S-W-29P; 仓库名称: 五金仓; 加工方式: 贴片; 物料名称: *; 规格型号: *; 物料代码: *; 助记码: *; 单位: *; 备注: *
footprint FPC  0.5  29P
pins: 0, 1, 2, 3, 4, 5, 6, 7, 8, 9, 10, 11, 12, 13, 14, 15, 16, 17, 18, 19, 20, 21, 22, 23, 24, 25, 26, 27, 28, 29

## FPC  0.5MM  30P
designator P*
FPC0.5 2H-S-W-30P; 仓库名称: 五金仓; 加工方式: 贴片; 规格型号: *; 物料名称: *; 物料代码: *; 备注: *; 单位: *; 助记码: *
footprint FPC  0.5  30P
pins: 0, 1, 2, 3, 4, 5, 6, 7, 8, 9, 10, 11, 12, 13, 14, 15, 16, 17, 18, 19, 20, 21, 22, 23, 24, 25, 26, 27, 28, 29, 30

## FPC  0.5MM  31P
designator P*
FPC0.5 2H-S-W-31P; 仓库名称: 五金仓; 加工方式: 贴片; 物料名称: *; 物料代码: *; 规格型号: *; 助记码: *; 单位: *; 备注: *
footprint FPC  0.5  31P
pins: 0, 1, 2, 3, 4, 5, 6, 7, 8, 9, 10, 11, 12, 13, 14, 15, 16, 17, 18, 19, 20, 21, 22, 23, 24, 25, 26, 27, 28, 29, 30, 31

## FPC  0.5MM  32P
designator P*
FPC0.5 2H-S-W-32P; 仓库名称: 五金仓; 加工方式: 贴片; 物料名称: *; 物料代码: *; 规格型号: *; 助记码: *; 备注: *; 单位: *
footprint FPC  0.5  32P
pins: 0, 1, 2, 3, 4, 5, 6, 7, 8, 9, 10, 11, 12, 13, 14, 15, 16, 17, 18, 19, 20, 21, 22, 23, 24, 25, 26, 27, 28, 29, 30, 31, 32

## FPC  0.5MM  33P
designator P*
FPC0.5 2H-S-W-33P; 仓库名称: 五金仓; 加工方式: 贴片; 规格型号: *; 单位: *; 助记码: *; 备注: *; 物料代码: *; 物料名称: *
footprint FPC  0.5  33P
pins: 0, 1, 2, 3, 4, 5, 6, 7, 8, 9, 10, 11, 12, 13, 14, 15, 16, 17, 18, 19, 20, 21, 22, 23, 24, 25, 26, 27, 28, 29, 30, 31, 32, 33

## FPC  0.5MM  34P
designator ?
FPC0.5 2H-S-W-34P; 仓库名称: 五金仓; 加工方式: 贴片; 单位: *; 助记码: *; 规格型号: *; 备注: *; 物料名称: *; 物料代码: *
footprint FPC  0.5  34P
pins: 0, 1, 2, 3, 4, 5, 6, 7, 8, 9, 10, 11, 12, 13, 14, 15, 16, 17, 18, 19, 20, 21, 22, 23, 24, 25, 26, 27, 28, 29, 30, 31, 32, 33, 34

## FPC  0.5MM  35P
designator P*
FPC0.5 2H-S-W-35P; 仓库名称: 五金仓; 加工方式: 贴片; 物料名称: *; 规格型号: *; 物料代码: *; 助记码: *; 单位: *; 备注: *
footprint FPC  0.5  35P
pins: 0, 1, 2, 3, 4, 5, 6, 7, 8, 9, 10, 11, 12, 13, 14, 15, 16, 17, 18, 19, 20, 21, 22, 23, 24, 25, 26, 27, 28, 29, 30, 31, 32, 33, 34, 35

## FPC  0.5MM  36P
designator P*, comment FPC  0.5MM   36P
FPC0.5 2H-S-W-36P; 仓库名称: 五金仓; 加工方式: 贴片; 物料名称: *; 规格型号: *; 物料代码: *; 助记码: *; 单位: *; 备注: *
footprint FPC  0.5  36P
pins: 0, 1, 2, 3, 4, 5, 6, 7, 8, 9, 10, 11, 12, 13, 14, 15, 16, 17, 18, 19, 20, 21, 22, 23, 24, 25, 26, 27, 28, 29, 30, 31, 32, 33, 34, 35, 36

## FPC  0.5MM  37P
designator P*
FPC0.5 2H-S-W-37P; 仓库名称: 五金仓; 加工方式: 贴片; 规格型号: *; 助记码: *; 单位: *; 物料代码: *; 物料名称: *; 备注: *
footprint FPC  0.5  37P
pins: 0, 1, 2, 3, 4, 5, 6, 7, 8, 9, 10, 11, 12, 13, 14, 15, 16, 17, 18, 19, 20, 21, 22, 23, 24, 25, 26, 27, 28, 29, 30, 31, 32, 33, 34, 35, 36, 37

## FPC  0.5MM  38P
designator P*
FPC0.5 2H-S-W-38P; 仓库名称: 五金仓; 加工方式: 贴片; 规格型号: *; 助记码: *; 单位: *; 备注: *; 物料代码: *; 物料名称: *
footprint FPC  0.5  38P
pins: 0, 1, 2, 3, 4, 5, 6, 7, 8, 9, 10, 11, 12, 13, 14, 15, 16, 17, 18, 19, 20, 21, 22, 23, 24, 25, 26, 27, 28, 29, 30, 31, 32, 33, 34, 35, 36, 37, 38

## FPC  0.5MM  39P
designator P*
FPC0.5 2H-S-W-39P; 仓库名称: 五金仓; 加工方式: 贴片; 物料名称: *; 规格型号: *; 单位: *; 备注: *; 物料代码: *; 助记码: *
footprint FPC  0.5  39P
pins: 0, 1, 2, 3, 4, 5, 6, 7, 8, 9, 10, 11, 12, 13, 14, 15, 16, 17, 18, 19, 20, 21, 22, 23, 24, 25, 26, 27, 28, 29, 30, 31, 32, 33, 34, 35, 36, 37, 38, 39

## FPC  0.5MM  40P
designator P*
FPC0.5 2H-S-W-40P; 仓库名称: 五金仓; 加工方式: 贴片; 规格型号: *; 助记码: *; 备注: *; 单位: *; 物料代码: *; 物料名称: *
footprint FPC  0.5  40P
pins: 0, 1, 2, 3, 4, 5, 6, 7, 8, 9, 10, 11, 12, 13, 14, 15, 16, 17, 18, 19, 20, 21, 22, 23, 24, 25, 26, 27, 28, 29, 30, 31, 32, 33, 34, 35, 36, 37, 38, 39, 40

## FPC  1.0MM  10P
designator P*
仓库名称: 五金仓; 加工方式: 贴片; 物料代码: *; 物料名称: *; 备注: *; 规格型号: *; 单位: *; 助记码: *
footprint FPC  1.0  10P (10 pins)
pins: 0, 1, 2, 3, 4, 5, 6, 7, 8, 9, 10

## FPC  1.0MM  11P
designator P*
仓库名称: 五金仓; 加工方式: 贴片; 物料代码: *; 物料名称: *; 备注: *; 规格型号: *; 单位: *; 助记码: *
footprint FPC  1.0  11P (11 Pins)
pins: 0, 1, 2, 3, 4, 5, 6, 7, 8, 9, 10, 11

## FPC  1.0MM  12P
designator P*
仓库名称: 五金仓; 加工方式: 贴片; 物料代码: *; 物料名称: *; 备注: *; 规格型号: *; 单位: *; 助记码: *
footprint FPC  1.0  12P (12 Pins)
pins: 0, 1, 2, 3, 4, 5, 6, 7, 8, 9, 10, 11, 12

## FPC  1.0MM  13P
designator P*
仓库名称: 五金仓; 加工方式: 贴片; 物料代码: *; 物料名称: *; 备注: *; 规格型号: *; 单位: *; 助记码: *
footprint FPC  1.0  13P (13 Pins)
pins: 0, 1, 2, 3, 4, 5, 6, 7, 8, 9, 10, 11, 12, 13

## FPC  1.0MM  14P
designator P*
仓库名称: 五金仓; 加工方式: 贴片; 物料代码: *; 物料名称: *; 备注: *; 规格型号: *; 单位: *; 助记码: *
footprint FPC  1.0  14P (14 Pns)
pins: 0, 1, 2, 3, 4, 5, 6, 7, 8, 9, 10, 11, 12, 13, 14
